# Altium footprint library vertigo.PcbLib: 115 footprints (part 1 of 8)
Each footprint in its own frame and in the unit in brackets; x right, y up, seen from the top. Pads: shape width x height; smd on the part's side, far side on the other; paste and mask are expansions set on the pad; w line width, h text height; cw(c..) or ccw(c..) is an arc to the next point about the centre after c.
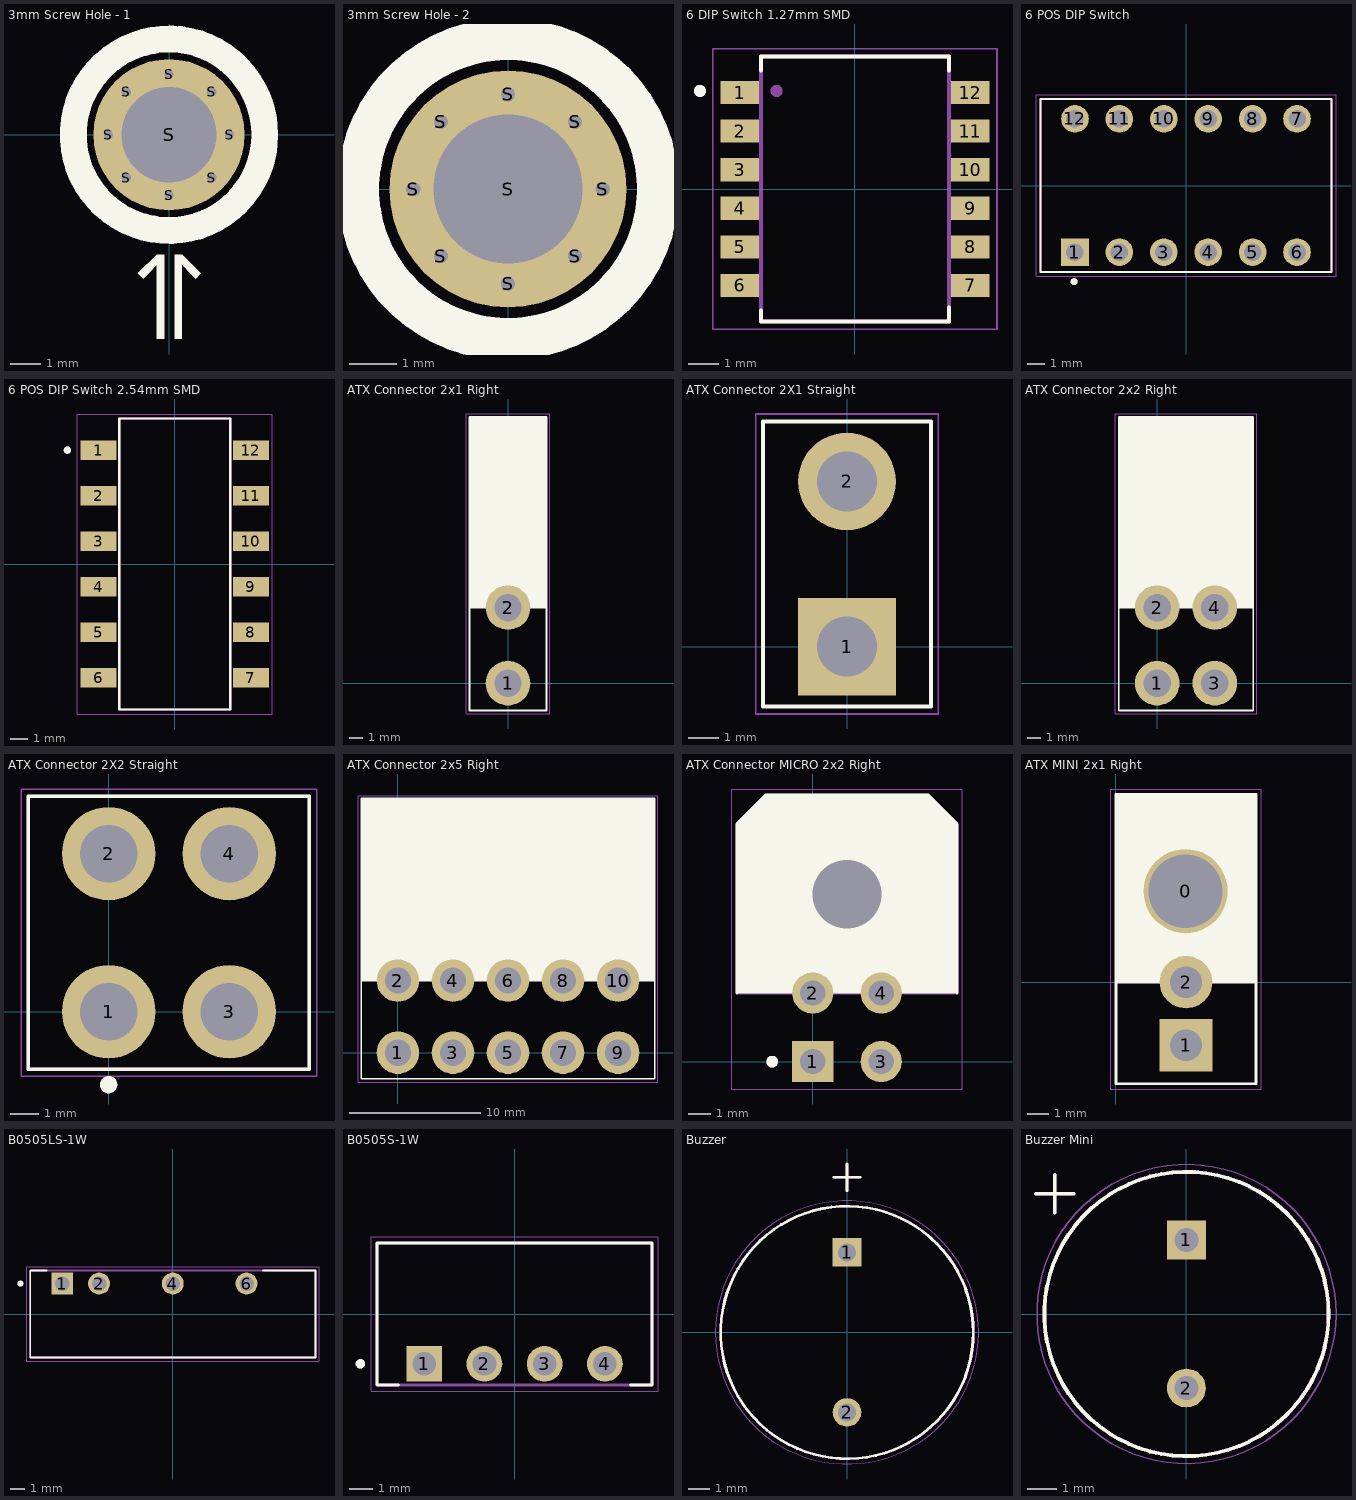
[diagram p0: the footprints below, top view; thin cyan lines are the x and y axes]

## 3mm Screw Hole - 1 [mm] "3mm Screw Hole"
pads (9):
  round 0.6 hole 0.3: S(-2,0) S(-1.414,-1.414) S(-1.414,1.414) S(0,-2) S(0,2) S(1.414,-1.414) S(1.414,1.414) S(2,0)
  round 5 hole 3.15 mask+0.1: S(0,0)
Top Overlay:
  circle w0.889: c0,0 r3.165
  region: 0.433,-3.957 0.253,-4.137 0.882,-4.765 1.062,-4.586
  rectangle: 0.179,-6.751 0.433,-3.957
  region: -1.038,-4.586 -0.859,-4.765 -0.23,-4.137 -0.41,-3.957
  region: -0.156,-3.957 -0.41,-3.957 -0.41,-6.751 -0.156,-6.751
3D body "User Library-User Library-4-40 x _125 sems.STEP": height 2.34, standoff -3, extent -2.667,-2.642 2.692,2.718

## 3mm Screw Hole - 2 [mm] "3mm Screw Hole"
pads (9):
  round 0.6 hole 0.3: S(-2,0) S(-1.414,-1.414) S(-1.414,1.414) S(0,-2) S(0,2) S(1.414,-1.414) S(1.414,1.414) S(2,0)
  round 5 hole 3.15 mask+0.1: S(0,0)
Top Overlay:
  circle w0.889: c0,0 r3.165
3D body "User Library-User Library-4-40 x _125 sems.STEP": height 2.34, standoff -3, extent -2.667,-2.642 2.692,2.718

## 6 DIP Switch 1.27mm SMD [mm] "1.27mm Surface Mount DIP Switch"
pads (12):
  rect 1.27x0.76 smd: 1(-3.795,3.175) 2(-3.795,1.905) 3(-3.795,0.635) 4(-3.795,-0.635) 5(-3.795,-1.905) 6(-3.795,-3.175) 7(3.795,-3.175) 8(3.795,-1.905) 9(3.795,-0.635) 10(3.795,0.635) 11(3.795,1.905) 12(3.795,3.175)
Top Overlay:
  circle w0.2: c-5.103,3.23 r0.1
  lines w0.127: -3.1,-4 -3.1,-4.37 3.1,-4.37 3.1,-3.9 ; -3.1,3.9 -3.1,4.37 3.1,4.37 3.1,3.9
Mechanical 13:
  circle w0.2: c-2.579,3.23 r0.1
  lines w0.127: -3.1,-4.37 -3.1,4.37 3.1,4.37 3.1,-4.37 -3.1,-4.37
Mechanical 15:
  lines w0.05: -4.68,-4.62 -4.68,4.62 4.68,4.62 4.68,-4.62 -4.68,-4.62
3D body "1571983-8.stp": height 2.31, standoff 0, extent -4.064,-4.369 4.064,4.369

## 6 POS DIP Switch [mm]
pads (12):
  rect 1.58x1.58 hole 1: 1(-6.35,-3.81)
  round 1.58 hole 1: 2(-3.81,-3.81) 3(-1.27,-3.81) 4(1.27,-3.81) 5(3.81,-3.81) 6(6.35,-3.81) 7(6.35,3.81) 8(3.81,3.81) 9(1.27,3.81) 10(-1.27,3.81) 11(-3.81,3.81) 12(-6.35,3.81)
Top Overlay:
  circle w0.2: c-6.4,-5.5 r0.1
  lines w0.127: -8.33,-4.95 -8.33,4.95 8.33,4.95 8.33,-4.95 -8.33,-4.95
Mechanical 13:
  circle w0.2: c-6.4,-5.5 r0.1
  lines w0.127: -8.33,-4.95 -8.33,4.95 8.33,4.95 8.33,-4.95 -8.33,-4.95
Mechanical 15:
  lines w0.05: -8.58,-5.2 -8.58,5.2 8.58,5.2 8.58,-5.2 -8.58,-5.2
3D body "CUI_DEVICES_DS01C-254-L-06BE.step": height 6.68, standoff -3.68, extent -8.33,-4.95 8.33,4.95

## 6 POS DIP Switch 2.54mm SMD [mm]
pads (12):
  rect 2x1.1 smd: 1(-4.25,6.35) 2(-4.25,3.81) 3(-4.25,1.27) 4(-4.25,-1.27) 5(-4.25,-3.81) 6(-4.25,-6.35) 7(4.25,-6.35) 8(4.25,-3.81) 9(4.25,-1.27) 10(4.25,1.27) 11(4.25,3.81) 12(4.25,6.35)
Top Overlay:
  circle w0.2: c-6,6.35 r0.1
  lines w0.127: -3.1,-8.12 -3.1,8.12 3.1,8.12 3.1,-8.12 -3.1,-8.12
Mechanical 13:
  circle w0.2: c-6,6.35 r0.1
  lines w0.127: -3.1,-8.12 -3.1,8.12 3.1,8.12 3.1,-8.12 -3.1,-8.12
Mechanical 15:
  lines w0.05: -5.45,-8.37 5.45,-8.37 5.45,8.37 -5.45,8.37 -5.45,-8.37
3D body "SMD DIP SWITCH 6P.step": height 4.36, standoff 0.04, extent -4.9,-8.09 4.9,8.09

## ATX Connector 2x1 Right [mm] "ATX Connector 2x1"
pads (2):
  round 3.25 hole 2: 1(0,0) 2(0,5.5)
Top Overlay:
  rectangle: -2.8,5.5 2.8,19.4
  lines w0.127: -2.8,5.5 -2.8,-2 2.8,-2 2.8,5.5 ; -2.8,5.5 2.8,5.5 ; -2.8,5.5 -2.8,19.4 2.8,19.4 2.8,5.5
Mechanical 15:
  lines w0.05: -3.048,-2.247 -3.048,19.597 3.048,19.597 3.048,-2.247 -3.048,-2.247
3D body "039301020.stp": height 11.4, standoff -3.6, extent -2.9,-0.535 2.9,19.4

## ATX Connector 2X1 Straight [mm] "ATX Connector 2X1"
pads (2):
  rect 3.25x3.25 hole 2: 1(0,0)
  round 3.25 hole 2: 2(0,5.5)
Top Overlay:
  lines w0.127: -2.8,-2 -2.8,7.5 2.8,7.5 2.8,-2 -2.8,-2
Mechanical 15:
  lines w0.05: -3.048,-2.247 -3.048,7.747 3.048,7.747 3.048,-2.247 -3.048,-2.247

## ATX Connector 2x2 Right [mm] "ATX Connector 2x2"
pads (4):
  round 3.25 hole 2: 1(0,0) 2(0,5.5) 3(4.2,0) 4(4.2,5.5)
Top Overlay:
  rectangle: -2.8,5.5 7,19.4
  lines w0.127: 6.985,-2 -2.8,-2 -2.8,5.5 ; 6.985,5.5 -2.8,5.5 ; 7,-2 7,5.5 7,19.4 -2.8,19.4 -2.8,5.5
Mechanical 15:
  lines w0.05: 7.239,19.597 -3.048,19.597 -3.048,-2.247 7.248,-2.247 7.248,19.597
3D body "039300040.stp": height 11.4, standoff -3.6, extent -2.9,-0.535 7.1,19.4

## ATX Connector 2X2 Straight [mm] "ATX Connector 2X2"
pads (4):
  round 3.25 hole 2: 1(0,0) 2(0,5.5) 3(4.2,0) 4(4.2,5.5)
Top Overlay:
  circle w0.3: c0,-2.54 r0.15
  lines w0.127: -2.8,-2 -2.8,7.5 6.985,7.5 6.985,-2 -2.8,-2
Mechanical 13:
  circle w0.3: c0,-2.54 r0.15
  lines w0.127: -2.8,-2 6.985,-2 6.985,7.5 -2.8,7.5 -2.8,-2
Mechanical 15:
  lines w0.05: -3.048,-2.247 -3.048,7.747 7.248,7.747 7.248,-2.247 -3.048,-2.247
3D body "2041443-2.stp": height 13, standoff -3, extent -2.825,-2.006 7.025,8.894

## ATX Connector 2x5 Right [mm] "ATX Connector 2x5"
pads (10):
  round 3.25 hole 2: 1(0,0) 2(0,5.5) 3(4.2,0) 4(4.2,5.5) 5(8.4,0) 6(8.4,5.5) 7(12.6,0) 8(12.6,5.5) 9(16.8,0) 10(16.8,5.5)
Top Overlay:
  rectangle: -2.8,5.5 19.6,19.4
  lines w0.127: -2.8,5.5 -2.8,-2 19.6,-2 19.6,5.5 ; -2.8,5.5 19.6,5.5 ; -2.8,5.5 -2.8,19.4 19.6,19.4 19.6,5.5
Mechanical 15:
  lines w0.05: -3.048,-2.247 19.848,-2.247 19.848,19.597 -3.048,19.597 -3.048,-2.247
3D body "039301020.stp": height 11.4, standoff -3.6, extent 13.9,-0.535 19.7,19.4
3D body "039300040.stp": height 11.4, standoff -3.6, extent -2.9,-0.535 7.1,19.4
3D body "039300040.stp": height 11.4, standoff -3.6, extent 5.5,-0.535 15.5,19.4

## ATX Connector MICRO 2x2 Right [mm]
pads (5):
  rect 1.8x1.8 hole 1.1: 1(0,0)
  round 1.8 hole 1.1: 2(0,3) 3(3,0) 4(3,3)
  round 0 hole 3: 5(1.5,7.32)
Top Overlay:
  circle w0.254: c-1.778,0 r0.127
  region: -3.325,3 -3.325,10.391 -2.032,11.684 5.032,11.684 6.325,10.391 6.325,3
  lines w0.127: -3.325,3 -3.325,10.391 -2.032,11.684 5.032,11.684 6.325,10.391 6.325,3
Mechanical 13:
  circle w0.254: c-1.778,0 r0.127
  lines w0.127: -3.325,3 -3.325,10.391 -2.032,11.684 5.032,11.684 6.325,10.391 6.325,3 -3.325,3
Mechanical 15:
  lines w0.05: -3.556,-1.2 -3.556,11.938 6.556,11.938 6.556,-1.2 -3.556,-1.2
3D body "43045-0401.stp": height 8.7, standoff -3.25, extent -3.575,-0.315 6.575,11.925

## ATX MINI 2x1 Right [mm] "ATX MINI 2x1 Right"
pads (3):
  round 4 hole 3.5: 0(3.302,4.32)
  rect 2.5x2.5 hole 1.5: 1(3.325,-3)
  round 2.5 hole 1.5: 2(3.325,0)
Top Overlay:
  rectangle: 0,0 6.65,8.92
  lines w0.127: 0,5.461 0,5.595 ; 0,0 0,-4.826 6.65,-4.826 6.65,0 ; 0,0 6.65,0 ; 0,0 0,8.92 6.65,8.92 6.65,0
Mechanical 15:
  lines w0.05: -0.25,-5.076 6.9,-5.076 6.9,0 6.9,9.17 -0.25,9.17 -0.25,0 -0.25,-5.076

## B0505LS-1W [mm]
pads (4):
  rect 1.508x1.508 hole 1: 1(-7.62,2.1)
  round 1.508 hole 1: 2(-5.08,2.1) 4(0,2.1) 6(5.08,2.1)
Top Overlay:
  circle w0.2: c-10.5,2.1 r0.1
  lines w0.127: -8.7,3 -9.825,3 -9.825,-3 9.825,-3 9.825,3 6.2,3
Mechanical 13:
  circle w0.2: c-10.5,2.1 r0.1
  lines w0.127: -9.825,-3 9.825,-3 9.825,3 -9.825,3 -9.825,-3
Mechanical 15:
  lines w0.05: -10.075,-3.25 -10.075,3.25 10.075,3.25 10.075,-3.25 -10.075,-3.25
3D body "step_temp.STEP": height 10.16, standoff -4.1, extent -9.825,-3 9.825,3

## B0505S-1W [mm] "Isolated DC-DC converter"
pads (4):
  rect 1.508x1.508 hole 1: 1(-3.81,-2.1)
  round 1.508 hole 1: 2(-1.27,-2.1) 3(1.27,-2.1) 4(3.81,-2.1)
Top Overlay:
  circle w0.2: c-6.5,-2.1 r0.1
  lines w0.127: -4.9,-3 -5.8,-3 -5.8,3 5.8,3 5.8,-3 4.9,-3
Mechanical 13:
  circle w0.2: c-6.5,-2.1 r0.1
  lines w0.127: -5.8,-3 5.8,-3 5.8,3 -5.8,3 -5.8,-3
Mechanical 15:
  lines w0.05: -6.05,-3.25 -6.05,3.25 6.05,3.25 6.05,-3.25 -6.05,-3.25
3D body "step_temp.STEP": height 10.16, standoff -4.1, extent -5.8,-3 5.8,3

## Buzzer [mm] "Diameter 12mm"
pads (2):
  rect 1.358x1.358 hole 0.85: 1(0,3.8)
  round 1.358 hole 0.85: 2(0,-3.8)
Top Overlay:
  circle w0.127: c0,0 r6
  lines w0.127: -0.635,7.366 0.635,7.366 ; 0,6.731 0,8.001
Mechanical 13:
  circle w0.127: c0,0 r6
  lines w0.127: -0.635,7.366 0.635,7.366 ; 0,6.731 0,8.001
Mechanical 15:
  circle w0.05: c0,0 r6.25
3D body "AI-1223-TWT-12V-R--3DModel-STEP-1.STEP": height 11.05, standoff -4.5, extent -5.999,-6 6,7.44

## Buzzer Mini [mm] "Diameter 9mm"
pads (2):
  rect 1.308x1.308 hole 0.8: 1(0,2.5)
  round 1.308 hole 0.8: 2(0,-2.5)
Top Overlay:
  circle w0.127: c0,0 r4.8
  lines w0.127: -5.08,4.064 -3.81,4.064 ; -4.445,3.429 -4.445,4.699
Mechanical 13:
  circle w0.127: c0,0 r4.8
  lines w0.127: -5.08,4.064 -3.81,4.064 ; -4.445,3.429 -4.445,4.699
Mechanical 15:
  circle w0.05: c0,0 r5.05
3D body "step_temp.STEP": height 5.05, standoff -5.5, extent -4.8,-4.8 4.8,5.952